# Altium footprint library Footprints.PcbLib: 236 footprints (part 4 of 15)
Each footprint in its own frame and in the unit in brackets; x right, y up, seen from the top. Pads: shape width x height; smd on the part's side, far side on the other; paste and mask are expansions set on the pad; w line width, h text height; cw(c..) or ccw(c..) is an arc to the next point about the centre after c.
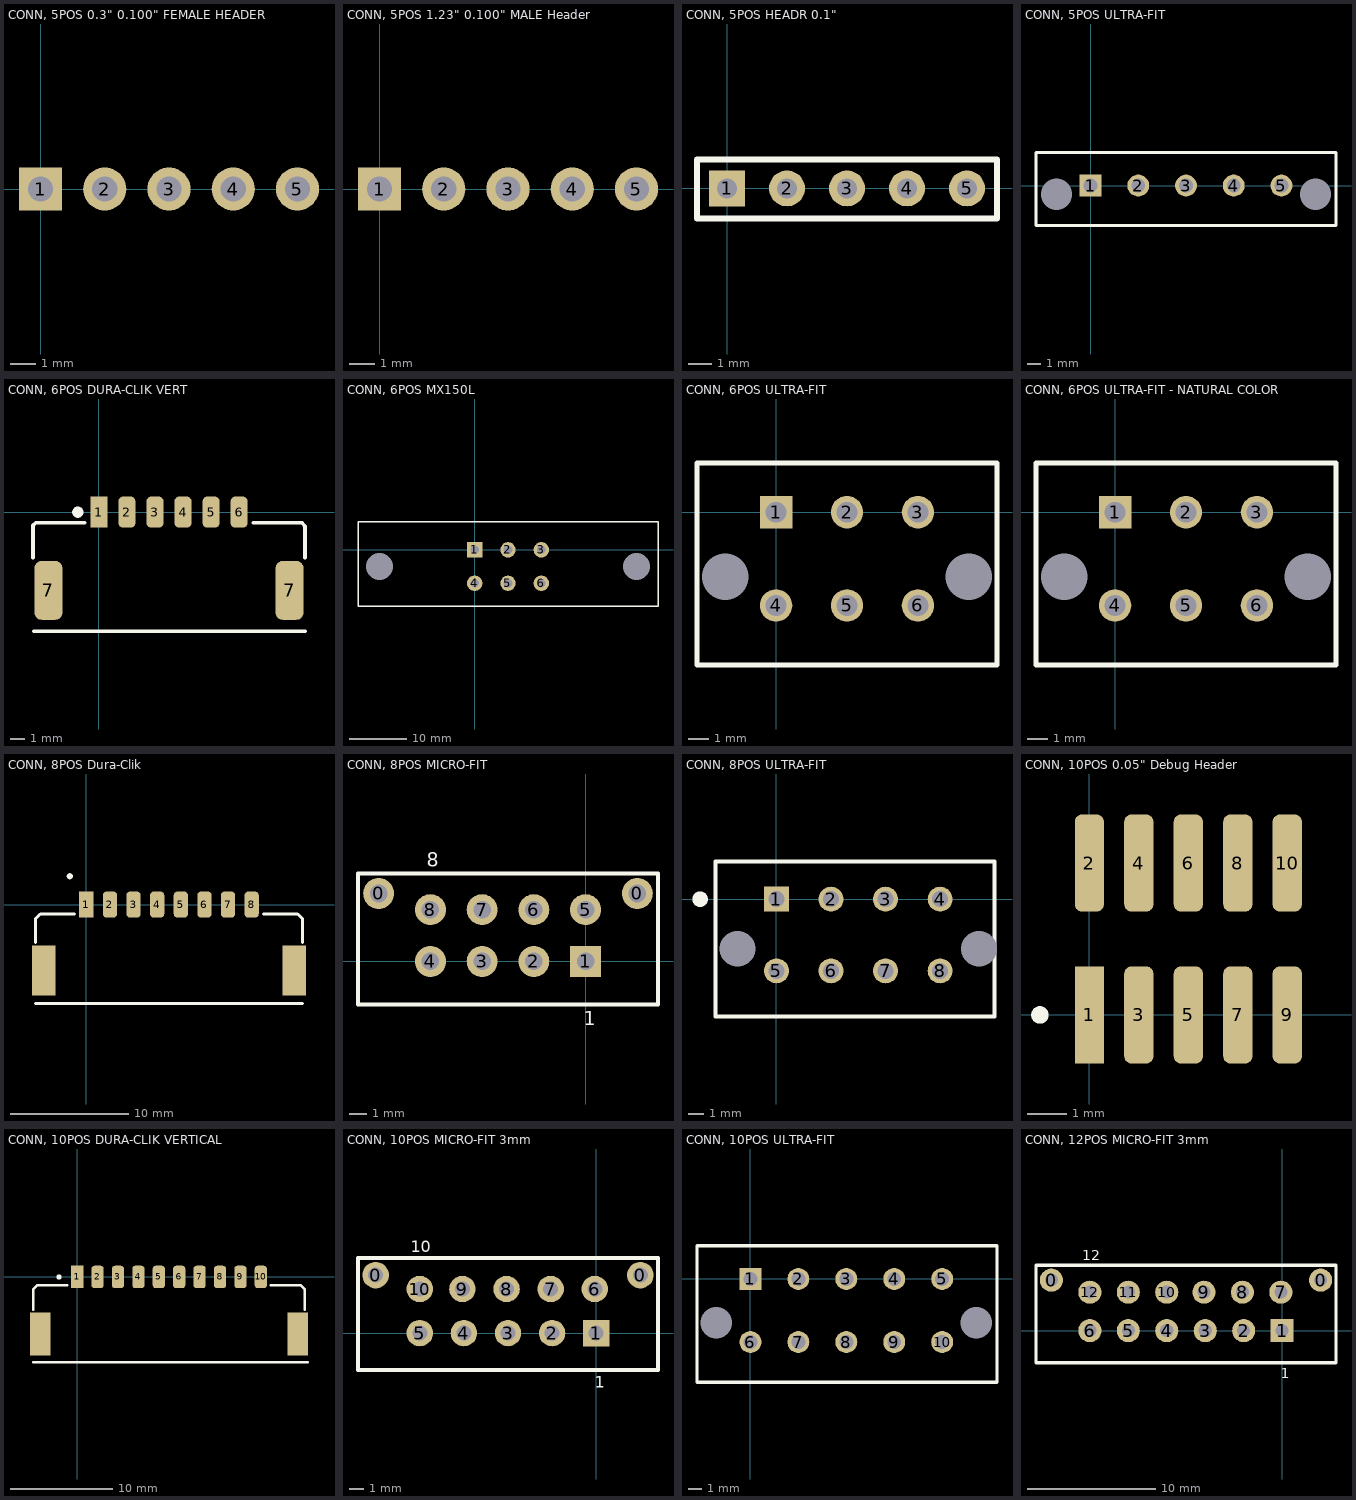
[diagram p3: the footprints below, top view; thin cyan lines are the x and y axes]

## CONN, 5POS 0.3" 0.100" FEMALE HEADER [mm]
pads (5):
  rect 1.7x1.7 hole 1: 1(0,0)
  round 1.7 hole 1: 2(2.54,0) 3(5.08,0) 4(7.62,0) 5(10.16,0)
3D body "SSW-105-01-T-S.stp": height 8.51, standoff -2.64, extent -1.524,-1.206 11.684,1.207

## CONN, 5POS 1.23" 0.100" MALE Header [mm]
pads (5):
  rect 1.7x1.7 hole 1: 1(0,0)
  round 1.7 hole 1: 2(2.54,0) 3(5.08,0) 4(7.62,0) 5(10.16,0)
3D body "TSW-105-20-T-S.stp": height 28.45, standoff -2.79, extent -1.397,-1.27 11.43,1.27

## CONN, 5POS HEADR 0.1" [mil]
pads (5):
  rect 60x60 hole 33.46: 1(0,0)
  round 60 hole 33.46: 2(100,0) 3(200,0) 4(300,0) 5(400,0)
Top Overlay:
  lines w10: -50,-50 450,-50 450,48 -50,48 -50,-50
3D body "022284050.stp": height 335, standoff -120, extent -50,-50 450,48

## CONN, 5POS ULTRA-FIT [mm]
height 14
pads (7):
  rect 1.6x1.6 hole 1.02: 1(0,0)
  round 1.6 hole 1.02: 2(3.5,0) 3(7,0) 4(10.5,0) 5(14,0)
  round 0 hole 2.3: ""(-2.5,-0.63) ""(16.5,-0.63)
Top Overlay:
  lines w0.254: -4,-2.93 18,-2.93 18,2.425 3.35,2.425 -4,2.425 -4,-2.93
3D body "1722871105.stp": height 13.85, standoff -3.3, extent -3.56,-2.84 17.54,5.82

## CONN, 6POS DURA-CLIK VERT [mm]
height 8
pads (8):
  rect 1.2x2.2 smd: 1(0,0)
  rrect50% 1.2x2.2 smd: 2(2,0) 3(4,0) 4(6,0) 5(8,0) 6(10,0)
  rrect50% 2x4.2 smd: 7(-3.6,-5.58) 7(13.6,-5.58)
Top Overlay:
  circle w0.5: c-1.5,0 r0.152
  lines w0.254: -4.7,-3.25 -4.7,-1 -4.7,-0.95 -4.5,-0.75 -1,-0.75 ; -4.65,-8.5 14.7,-8.5 ; 11,-0.75 14.5,-0.75 14.5,-0.8 14.7,-1 14.7,-3.25
3D body "5600200620.stp": height 7.97, standoff -0.03, extent -4.347,-8.543 14.253,0.607

## CONN, 6POS MX150L [mm]
pads (8):
  rect 2.7x2.7 hole 1.52: 1(0,0)
  round 2.7 hole 1.52: 2(5.84,0) 3(11.68,0) 4(0,-5.85) 5(5.84,-5.85) 6(11.68,-5.85)
  round 0 hole 4.78: ""(-16.69,-2.925) ""(28.37,-2.925)
Top Overlay:
  lines w0.254: -20.447,-9.906 -20.447,4.953 32.131,4.953 32.131,-9.906 -20.447,-9.906
3D body "194270018.stp": height 32.32, standoff -3.25, extent -20.197,-34.823 31.881,4.826

## CONN, 6POS ULTRA-FIT [mm]
pads (8):
  rect 1.6x1.6 hole 1.02: 1(0,0)
  round 1.6 hole 1.02: 2(3.5,0) 3(7,0) 4(0,-4.6) 5(3.5,-4.6) 6(7,-4.6)
  round 0 hole 2.3: ""(-2.5,-3.18) ""(9.5,-3.18)
Top Overlay:
  lines w0.254: -3.9,-7.53 10.9,-7.53 10.9,2.42 -3.9,2.42 -3.9,-7.53
3D body "1722991106.stp": height 13.9, standoff -3.3, extent -3.55,-8.25 10.55,5.66

## CONN, 6POS ULTRA-FIT - NATURAL COLOR [mm]
pads (8):
  rect 1.6x1.6 hole 1.02: 1(0,0)
  round 1.6 hole 1.02: 2(3.5,0) 3(7,0) 4(0,-4.6) 5(3.5,-4.6) 6(7,-4.6)
  round 0 hole 2.3: ""(-2.5,-3.18) ""(9.5,-3.18)
Top Overlay:
  lines w0.254: -3.9,-7.53 10.9,-7.53 10.9,2.42 -3.9,2.42 -3.9,-7.53
3D body "1722991106.stp": height 13.9, standoff -3.3, extent -3.55,-8.25 10.55,5.66

## CONN, 8POS Dura-Clik [mm] "WM10868CT-ND"
pads (10):
  rect 1.2x2.2 smd: 1(0,0)
  rrect50% 1.2x2.2 smd: 2(2,0) 3(4,0) 4(6,0) 5(8,0) 6(10,0) 7(12,0) 8(14,0)
  rect 2x4.2 smd: ""(-3.6,-5.58) ""(17.6,-5.58)
Top Overlay:
  circle w0.26: c-1.4,2.4 r0.13
  lines w0.254: -4.3,-8.36 18.3,-8.36 ; -4.3,-3.2 -4.3,-1.2 -3.9,-0.8 -1,-0.8 ; 15,-0.8 17.9,-0.8 18.3,-1.2 18.3,-3.2
3D body "5600200820.stp": height 8.02, standoff 0.02, extent -4.3,-8.36 18.3,0.79

## CONN, 8POS MICRO-FIT [mm]
pads (10):
  round 1.8 hole 1.02: 0(-12,3.94) 0(3,3.94) 2(-3,0) 3(-6,0) 4(-9,0) 5(0,3) 6(-3,3) 7(-6,3) 8(-9,3)
  rect 1.8x1.8 hole 1.02: 1(0,0)
Top Overlay:
  lines w0.254: -13.2,-2.5 -13.2,5.1 4.2,5.1 4.2,-2.5 -13.2,-2.5
  text "1" at -0.1,-3.7 h0.8
  text "8" at -9.2,5.5 h0.8
3D body "430450827.stp": height 9.95, standoff -3.14, extent -12.65,-2.485 3.5,6.285

## CONN, 8POS ULTRA-FIT [mm]
pads (10):
  rect 1.6x1.6 hole 1.02: 1(0,0)
  round 1.6 hole 1.02: 2(3.5,0) 3(7,0) 4(10.5,0) 5(0,-4.6) 6(3.5,-4.6) 7(7,-4.6) 8(10.5,-4.6)
  round 0 hole 2.3: ""(-2.5,-3.18) ""(13,-3.18)
Top Overlay:
  circle w0.6: c-4.9,0 r0.2
  lines w0.254: -3.9,-7.53 14,-7.53 14,2.42 -3.9,2.42 -3.9,-7.53
3D body "1722991108.stp": height 13.9, standoff -3.3, extent -3.64,-8.14 13.96,5.77

## CONN, 10POS 0.05" Debug Header [mm] "Amphenol 10 Positions Header Connector 0.050\" (1.27mm) Surface Mount Gold"
pads (10):
  rect 0.75x2.5 smd: 1(0,0)
  rrect50% 0.75x2.5 smd: 2(0,3.9) 3(1.27,0) 4(1.27,3.9) 5(2.54,0) 6(2.54,3.9) 7(3.81,0) 8(3.81,3.9) 9(5.08,0) 10(5.08,3.9)
Top Overlay:
  circle w0.25: c-1.27,0 r0.1
3D body "20021121-00010XXLFc.stp": height 4.5, standoff 0, extent -0.635,-0.845 5.715,4.655

## CONN, 10POS DURA-CLIK VERTICAL [mm]
pads (12):
  rect 1.2x2.2 smd: 1(0,0)
  rrect50% 1.2x2.2 smd: 2(2,0) 3(4,0) 4(6,0) 5(8,0) 6(10,0) 7(12,0) 8(14,0) 9(16,0) 10(18,0)
  rect 2x4.2 smd: ""(-3.6,-5.58) ""(21.6,-5.58)
Top Overlay:
  circle w0.26: c-1.778,0 r0.13
  lines w0.254: -4.3,-8.36 18.3,-8.36 22.584,-8.36 ; -4.3,-3.2 -4.3,-1.2 -3.9,-0.8 -1,-0.8 ; 19,-0.8 21.9,-0.8 22.3,-1.2 22.3,-3.2
3D body "5600201020.stp": height 8.03, standoff 0.03, extent -4.318,-8.388 22.282,0.762

## CONN, 10POS MICRO-FIT 3mm [mm]
pads (12):
  round 1.8 hole 1.02: 0(-15,3.94) 0(3,3.94) 2(-3,0) 3(-6,0) 4(-9,0) 5(-12,0) 6(-0.1,3) 7(-3.1,3) 8(-6.1,3) 9(-9.1,3) 10(-12,3)
  rect 1.8x1.8 hole 1.02: 1(0,0)
Top Overlay:
  lines w0.254: -16.2,-2.5 -16.2,5.1 4.2,5.1 4.2,-2.5 -16.2,-2.5
  text "1" at -0.1,-3.7 h0.8
  text "10" at -12.6,5.5 h0.8
3D body "430451027.stp": height 9.95, standoff -3.14, extent -15.575,-2.5 3.575,6.27

## CONN, 10POS ULTRA-FIT [mm]
pads (12):
  rect 1.6x1.6 hole 1.02: 1(0,0)
  round 1.6 hole 1.02: 2(3.5,0) 3(7,0) 4(10.5,0) 5(14,0) 6(0,-4.6) 7(3.5,-4.6) 8(7,-4.6) 9(10.5,-4.6) 10(14,-4.6)
  round 0 hole 2.3: ""(-2.5,-3.18) ""(16.5,-3.18)
Top Overlay:
  lines w0.254: -3.9,-7.53 18,-7.53 18,2.42 -3.9,2.42 -3.9,-7.53
3D body "1722991110.stp": height 13.9, standoff -3.3, extent -3.55,-8.15 17.55,5.76

## CONN, 12POS MICRO-FIT 3mm [mm]
pads (14):
  round 1.8 hole 1.02: 0(-18,3.94) 0(3,3.94) 2(-3,0) 3(-6,0) 4(-9,0) 5(-12,0) 6(-15,0) 7(-0.1,3) 8(-3.1,3) 9(-6.1,3) 10(-9,3) 11(-12,3) 12(-15,3)
  rect 1.8x1.8 hole 1.02: 1(0,0)
Top Overlay:
  lines w0.254: -19.2,-2.5 4.2,-2.5 4.2,5.1 -19.2,5.1 -19.2,-2.5
  text "12" at -15.6,5.5 h0.8
  text "1" at -0.1,-3.7 h0.8
3D body "430451227.stp": height 9.95, standoff -3.14, extent -18.575,-2.5 3.575,6.27